# Altium footprint library Kon_Tipk.PCBLIB: 113 footprints (part 8 of 8)
Each footprint in its own frame and in the unit in brackets; x right, y up, seen from the top. Pads: shape width x height; smd on the part's side, far side on the other; paste and mask are expansions set on the pad; w line width, h text height; cw(c..) or ccw(c..) is an arc to the next point about the centre after c.
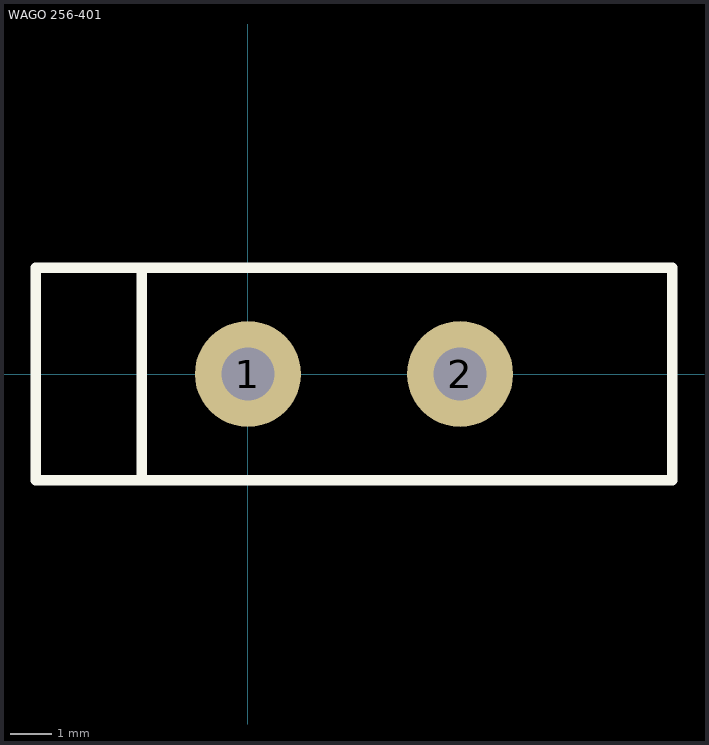
[diagram p7: the footprint, top view; thin cyan lines are the x and y axes]

## WAGO 256-401 [mm]
pads (2):
  round 2.54 hole 1.27: 1(0,0) 2(5.08,0)
Top Overlay:
  lines w0.254: -2.54,-2.54 -2.54,2.54 ; -5.08,-2.54 -5.08,2.54 10.16,2.54 10.16,-2.54 -5.08,-2.54